# Altium schematic symbol library jlcpcb_2025_04_capacitors_extended_1210.schlib: 709 symbols (part 4 of 4) (continued)
## GRM32ER61C226KE20L
designator C?  Capacitance: 22uF  (hidden comment: *)
Capacitor, Ceramic (MLCC), 22uF, ±10%, 16V, X5R, ±10%, SMD 1210; Manufacturer: Murata Electronics; Manufacturer Part Number: GRM32ER61C226KE20L; Package Size: 1210; JLCPCB Basic Part: No; JLCPCB Part Number: C86051; Supplier 1: LCSC; Category: Capacitors - MLCC; Supplier Part Number 1: C86051; Tolerance: ±10%; Voltage Rating: 16V; Temperature Coefficient: X5R; RoHS: Yes; ComponentLink1Description: Datasheet; ComponentLink1URL: https://wmsc.lcsc.com/wmsc/upload/file/pdf/v2/lcsc/2304140030_Murata-Electronics-GRM32ER61C226KE20L_C86051.pdf; ComponentLink2Description: JLCPCB Part URL; ComponentLink2URL: https://jlcpcb.com/partdetail/C86051; ComponentLink3Description: LCSC Part URL; ComponentLink3URL: https://lcsc.com/product-detail/Multilayer-Ceramic-Capacitors-MLCC---SMD-SMT_Murata-Electronics-Murata-Electronics-GRM32ER61C226KE20L_C86051.html
footprint CAP-1210 (1210 (3225M) Capacitor)
pins: 1, 2

## GRM32ER61C476KE15K
designator C?  Capacitance: 47uF  (hidden comment: *)
Capacitor, Ceramic (MLCC), 47uF, ±10%, 16V, X5R, ±10%, SMD 1210; Manufacturer: Murata Electronics; Manufacturer Part Number: GRM32ER61C476KE15K; Package Size: 1210; JLCPCB Basic Part: No; JLCPCB Part Number: C3908068; Supplier 1: LCSC; Category: Capacitors - MLCC; Supplier Part Number 1: C3908068; Tolerance: ±10%; Voltage Rating: 16V; Temperature Coefficient: X5R; RoHS: Yes; ComponentLink1Description: Datasheet; ComponentLink1URL: https://wmsc.lcsc.com/wmsc/upload/file/pdf/v2/lcsc/2308111519_Murata-Electronics-GRM32ER61C476KE15K_C3908068.pdf; ComponentLink2Description: JLCPCB Part URL; ComponentLink2URL: https://jlcpcb.com/partdetail/C3908068; ComponentLink3Description: LCSC Part URL; ComponentLink3URL: https://lcsc.com/product-detail/Multilayer-Ceramic-Capacitors-MLCC---SMD-SMT_Murata-Electronics-Murata-Electronics-GRM32ER61C476KE15K_C3908068.html
footprint CAP-1210 (1210 (3225M) Capacitor)
pins: 1, 2

## GRM32ER61C476KE15L
designator C?  Capacitance: 47uF  (hidden comment: *)
Capacitor, Ceramic (MLCC), 47uF, ±10%, 16V, X5R, ±10%, SMD 1210; Manufacturer: Murata Electronics; Manufacturer Part Number: GRM32ER61C476KE15L; Package Size: 1210; JLCPCB Basic Part: No; JLCPCB Part Number: C77101; Supplier 1: LCSC; Category: Capacitors - MLCC; Supplier Part Number 1: C77101; Tolerance: ±10%; Voltage Rating: 16V; Temperature Coefficient: X5R; RoHS: Yes; ComponentLink1Description: Datasheet; ComponentLink1URL: https://wmsc.lcsc.com/wmsc/upload/file/pdf/v2/lcsc/2212021100_Murata-Electronics-GRM32ER61C476KE15L_C77101.pdf; ComponentLink2Description: JLCPCB Part URL; ComponentLink2URL: https://jlcpcb.com/partdetail/C77101; ComponentLink3Description: LCSC Part URL; ComponentLink3URL: https://lcsc.com/product-detail/Multilayer-Ceramic-Capacitors-MLCC---SMD-SMT_Murata-Electronics-Murata-Electronics-GRM32ER61C476KE15L_C77101.html
footprint CAP-1210 (1210 (3225M) Capacitor)
pins: 1, 2

## GRM32ER61C476ME15L
designator C?  Capacitance: 47uF  (hidden comment: *)
Capacitor, Ceramic (MLCC), 47uF, ±20%, 16V, X5R, ±20%, SMD 1210; Manufacturer: Murata Electronics; Manufacturer Part Number: GRM32ER61C476ME15L; Package Size: 1210; JLCPCB Basic Part: No; JLCPCB Part Number: C412254; Supplier 1: LCSC; Category: Capacitors - MLCC; Supplier Part Number 1: C412254; Tolerance: ±20%; Voltage Rating: 16V; Temperature Coefficient: X5R; RoHS: Yes; ComponentLink1Description: Datasheet; ComponentLink1URL: https://wmsc.lcsc.com/wmsc/upload/file/pdf/v2/lcsc/2304140030_Murata-Electronics-GRM32ER61C476ME15L_C412254.pdf; ComponentLink2Description: JLCPCB Part URL; ComponentLink2URL: https://jlcpcb.com/partdetail/C412254; ComponentLink3Description: LCSC Part URL; ComponentLink3URL: https://lcsc.com/product-detail/Multilayer-Ceramic-Capacitors-MLCC---SMD-SMT_Murata-Electronics-Murata-Electronics-GRM32ER61C476ME15L_C412254.html
footprint CAP-1210 (1210 (3225M) Capacitor)
pins: 1, 2

## GRM32ER61E226KE15K
designator C?  Capacitance: 22uF  (hidden comment: *)
Capacitor, Ceramic (MLCC), 22uF, ±10%, 25V, X5R, ±10%, SMD 1210; Manufacturer: Murata Electronics; Manufacturer Part Number: GRM32ER61E226KE15K; Package Size: 1210; JLCPCB Basic Part: No; JLCPCB Part Number: C185655; Supplier 1: LCSC; Category: Capacitors - MLCC; Supplier Part Number 1: C185655; Tolerance: ±10%; Voltage Rating: 25V; Temperature Coefficient: X5R; RoHS: Yes; ComponentLink1Description: Datasheet; ComponentLink1URL: https://wmsc.lcsc.com/wmsc/upload/file/pdf/v2/lcsc/1810250922_Murata-Electronics-GRM32ER61E226KE15K_C185655.pdf; ComponentLink2Description: JLCPCB Part URL; ComponentLink2URL: https://jlcpcb.com/partdetail/C185655; ComponentLink3Description: LCSC Part URL; ComponentLink3URL: https://lcsc.com/product-detail/Multilayer-Ceramic-Capacitors-MLCC---SMD-SMT_Murata-Electronics-Murata-Electronics-GRM32ER61E226KE15K_C185655.html
footprint CAP-1210 (1210 (3225M) Capacitor)
pins: 1, 2

## GRM32ER61E226KE15L
designator C?  Capacitance: 22uF  (hidden comment: *)
Capacitor, Ceramic (MLCC), 22uF, ±10%, 25V, X5R, ±10%, SMD 1210; Manufacturer: Murata Electronics; Manufacturer Part Number: GRM32ER61E226KE15L; Package Size: 1210; JLCPCB Basic Part: No; JLCPCB Part Number: C65428; Supplier 1: LCSC; Category: Capacitors - MLCC; Supplier Part Number 1: C65428; Tolerance: ±10%; Voltage Rating: 25V; Temperature Coefficient: X5R; RoHS: Yes; ComponentLink1Description: Datasheet; ComponentLink1URL: https://wmsc.lcsc.com/wmsc/upload/file/pdf/v2/lcsc/1810250907_Murata-Electronics-GRM32ER61E226KE15L_C65428.pdf; ComponentLink2Description: JLCPCB Part URL; ComponentLink2URL: https://jlcpcb.com/partdetail/C65428; ComponentLink3Description: LCSC Part URL; ComponentLink3URL: https://lcsc.com/product-detail/Multilayer-Ceramic-Capacitors-MLCC---SMD-SMT_Murata-Electronics-Murata-Electronics-GRM32ER61E226KE15L_C65428.html
footprint CAP-1210 (1210 (3225M) Capacitor)
pins: 1, 2

## GRM32ER61E226ME15L
designator C?  Capacitance: 22uF  (hidden comment: *)
Capacitor, Ceramic (MLCC), 22uF, ±20%, 25V, X5R, ±20%, SMD 1210; Manufacturer: Murata Electronics; Manufacturer Part Number: GRM32ER61E226ME15L; Package Size: 1210; JLCPCB Basic Part: No; JLCPCB Part Number: C97971; Supplier 1: LCSC; Category: Capacitors - MLCC; Supplier Part Number 1: C97971; Tolerance: ±20%; Voltage Rating: 25V; Temperature Coefficient: X5R; RoHS: Yes; ComponentLink1Description: Datasheet; ComponentLink1URL: https://wmsc.lcsc.com/wmsc/upload/file/pdf/v2/lcsc/1810250908_Murata-Electronics-GRM32ER61E226ME15L_C97971.pdf; ComponentLink2Description: JLCPCB Part URL; ComponentLink2URL: https://jlcpcb.com/partdetail/C97971; ComponentLink3Description: LCSC Part URL; ComponentLink3URL: https://lcsc.com/product-detail/Multilayer-Ceramic-Capacitors-MLCC---SMD-SMT_Murata-Electronics-Murata-Electronics-GRM32ER61E226ME15L_C97971.html
footprint CAP-1210 (1210 (3225M) Capacitor)
pins: 1, 2

## GRM32ER61H106KA12L
designator C?  Capacitance: 10uF  (hidden comment: *)
Capacitor, Ceramic (MLCC), 10uF, ±10%, 50V, X5R, ±10%, SMD 1210; Manufacturer: Murata Electronics; Manufacturer Part Number: GRM32ER61H106KA12L; Package Size: 1210; JLCPCB Basic Part: No; JLCPCB Part Number: C412253; Supplier 1: LCSC; Category: Capacitors - MLCC; Supplier Part Number 1: C412253; Tolerance: ±10%; Voltage Rating: 50V; Temperature Coefficient: X5R; RoHS: Yes; ComponentLink1Description: Datasheet; ComponentLink1URL: https://wmsc.lcsc.com/wmsc/upload/file/pdf/v2/lcsc/2304140030_Murata-Electronics-GRM32ER61H106KA12L_C412253.pdf; ComponentLink2Description: JLCPCB Part URL; ComponentLink2URL: https://jlcpcb.com/partdetail/C412253; ComponentLink3Description: LCSC Part URL; ComponentLink3URL: https://lcsc.com/product-detail/Multilayer-Ceramic-Capacitors-MLCC---SMD-SMT_Murata-Electronics-Murata-Electronics-GRM32ER61H106KA12L_C412253.html
footprint CAP-1210 (1210 (3225M) Capacitor)
pins: 1, 2

## GRM32ER70J476KE20L
designator C?  Capacitance: 47uF  (hidden comment: *)
Capacitor, Ceramic (MLCC), 47uF, ±10%, 6.3V, X7R, ±10%, SMD 1210; Manufacturer: Murata Electronics; Manufacturer Part Number: GRM32ER70J476KE20L; Package Size: 1210; JLCPCB Basic Part: No; JLCPCB Part Number: C440210; Supplier 1: LCSC; Category: Capacitors - MLCC; Supplier Part Number 1: C440210; Tolerance: ±10%; Voltage Rating: 6.3V; Temperature Coefficient: X7R; RoHS: Yes; ComponentLink1Description: Datasheet; ComponentLink1URL: https://wmsc.lcsc.com/wmsc/upload/file/pdf/v2/lcsc/2304140030_Murata-Electronics-GRM32ER70J476KE20L_C440210.pdf; ComponentLink2Description: JLCPCB Part URL; ComponentLink2URL: https://jlcpcb.com/partdetail/C440210; ComponentLink3Description: LCSC Part URL; ComponentLink3URL: https://lcsc.com/product-detail/Multilayer-Ceramic-Capacitors-MLCC---SMD-SMT_Murata-Electronics-Murata-Electronics-GRM32ER70J476KE20L_C440210.html
footprint CAP-1210 (1210 (3225M) Capacitor)
pins: 1, 2

## GRM32ER70J476ME20L
designator C?  Capacitance: 47uF  (hidden comment: *)
Capacitor, Ceramic (MLCC), 47uF, ±20%, 6.3V, X7R, ±20%, SMD 1210; Manufacturer: Murata Electronics; Manufacturer Part Number: GRM32ER70J476ME20L; Package Size: 1210; JLCPCB Basic Part: No; JLCPCB Part Number: C415374; Supplier 1: LCSC; Category: Capacitors - MLCC; Supplier Part Number 1: C415374; Tolerance: ±20%; Voltage Rating: 6.3V; Temperature Coefficient: X7R; RoHS: Yes; ComponentLink1Description: Datasheet; ComponentLink1URL: https://wmsc.lcsc.com/wmsc/upload/file/pdf/v2/lcsc/2304140030_Murata-Electronics-GRM32ER70J476ME20L_C415374.pdf; ComponentLink2Description: JLCPCB Part URL; ComponentLink2URL: https://jlcpcb.com/partdetail/C415374; ComponentLink3Description: LCSC Part URL; ComponentLink3URL: https://lcsc.com/product-detail/Multilayer-Ceramic-Capacitors-MLCC---SMD-SMT_Murata-Electronics-Murata-Electronics-GRM32ER70J476ME20L_C415374.html
footprint CAP-1210 (1210 (3225M) Capacitor)
pins: 1, 2

## GRM32ER71A226ME20L
designator C?  Capacitance: 22uF  (hidden comment: *)
Capacitor, Ceramic (MLCC), 22uF, ±20%, 10V, X7R, ±20%, SMD 1210; Manufacturer: Murata Electronics; Manufacturer Part Number: GRM32ER71A226ME20L; Package Size: 1210; JLCPCB Basic Part: No; JLCPCB Part Number: C527971; Supplier 1: LCSC; Category: Capacitors - MLCC; Supplier Part Number 1: C527971; Tolerance: ±20%; Voltage Rating: 10V; Temperature Coefficient: X7R; RoHS: Yes; ComponentLink1Description: Datasheet; ComponentLink1URL: https://wmsc.lcsc.com/wmsc/upload/file/pdf/v2/lcsc/2304140030_Murata-Electronics-GRM32ER71A226ME20L_C527971.pdf; ComponentLink2Description: JLCPCB Part URL; ComponentLink2URL: https://jlcpcb.com/partdetail/C527971; ComponentLink3Description: LCSC Part URL; ComponentLink3URL: https://lcsc.com/product-detail/Multilayer-Ceramic-Capacitors-MLCC---SMD-SMT_Murata-Electronics-Murata-Electronics-GRM32ER71A226ME20L_C527971.html
footprint CAP-1210 (1210 (3225M) Capacitor)
pins: 1, 2

## GRM32ER71A476KE15L
designator C?  Capacitance: 47uF  (hidden comment: *)
Capacitor, Ceramic (MLCC), 47uF, ±10%, 10V, X7R, ±10%, SMD 1210; Manufacturer: Murata Electronics; Manufacturer Part Number: GRM32ER71A476KE15L; Package Size: 1210; JLCPCB Basic Part: No; JLCPCB Part Number: C84494; Supplier 1: LCSC; Category: Capacitors - MLCC; Supplier Part Number 1: C84494; Tolerance: ±10%; Voltage Rating: 10V; Temperature Coefficient: X7R; RoHS: Yes; ComponentLink1Description: Datasheet; ComponentLink1URL: https://wmsc.lcsc.com/wmsc/upload/file/pdf/v2/lcsc/1811071031_Murata-Electronics-GRM32ER71A476KE15L_C84494.pdf; ComponentLink2Description: JLCPCB Part URL; ComponentLink2URL: https://jlcpcb.com/partdetail/C84494; ComponentLink3Description: LCSC Part URL; ComponentLink3URL: https://lcsc.com/product-detail/Multilayer-Ceramic-Capacitors-MLCC---SMD-SMT_Murata-Electronics-Murata-Electronics-GRM32ER71A476KE15L_C84494.html
footprint CAP-1210 (1210 (3225M) Capacitor)
pins: 1, 2

## GRM32ER71A476ME15L
designator C?  Capacitance: 47uF  (hidden comment: *)
Capacitor, Ceramic (MLCC), 47uF, ±20%, 10V, X7R, ±20%, SMD 1210; Manufacturer: Murata Electronics; Manufacturer Part Number: GRM32ER71A476ME15L; Package Size: 1210; JLCPCB Basic Part: No; JLCPCB Part Number: C415541; Supplier 1: LCSC; Category: Capacitors - MLCC; Supplier Part Number 1: C415541; Tolerance: ±20%; Voltage Rating: 10V; Temperature Coefficient: X7R; RoHS: Yes; ComponentLink1Description: Datasheet; ComponentLink1URL: https://wmsc.lcsc.com/wmsc/upload/file/pdf/v2/lcsc/2304140030_Murata-Electronics-GRM32ER71A476ME15L_C415541.pdf; ComponentLink2Description: JLCPCB Part URL; ComponentLink2URL: https://jlcpcb.com/partdetail/C415541; ComponentLink3Description: LCSC Part URL; ComponentLink3URL: https://lcsc.com/product-detail/Multilayer-Ceramic-Capacitors-MLCC---SMD-SMT_Murata-Electronics-Murata-Electronics-GRM32ER71A476ME15L_C415541.html
footprint CAP-1210 (1210 (3225M) Capacitor)
pins: 1, 2

## GRM32ER71C226KEA8L
designator C?  Capacitance: 22uF  (hidden comment: *)
Capacitor, Ceramic (MLCC), 22uF, ±10%, 16V, X7R, ±10%, SMD 1210; Manufacturer: Murata Electronics; Manufacturer Part Number: GRM32ER71C226KEA8L; Package Size: 1210; JLCPCB Basic Part: No; JLCPCB Part Number: C703078; Supplier 1: LCSC; Category: Capacitors - MLCC; Supplier Part Number 1: C703078; Tolerance: ±10%; Voltage Rating: 16V; Temperature Coefficient: X7R; RoHS: Yes; ComponentLink1Description: Datasheet; ComponentLink1URL: https://wmsc.lcsc.com/wmsc/upload/file/pdf/v2/lcsc/2304140030_Murata-Electronics-GRM32ER71C226KEA8L_C703078.pdf; ComponentLink2Description: JLCPCB Part URL; ComponentLink2URL: https://jlcpcb.com/partdetail/C703078; ComponentLink3Description: LCSC Part URL; ComponentLink3URL: https://lcsc.com/product-detail/Multilayer-Ceramic-Capacitors-MLCC---SMD-SMT_Murata-Electronics-Murata-Electronics-GRM32ER71C226KEA8L_C703078.html
footprint CAP-1210 (1210 (3225M) Capacitor)
pins: 1, 2

## GRM32ER71C226MEA8L
designator C?  Capacitance: 22uF  (hidden comment: *)
Capacitor, Ceramic (MLCC), 22uF, ±20%, 16V, X7R, ±20%, SMD 1210; Manufacturer: Murata Electronics; Manufacturer Part Number: GRM32ER71C226MEA8L; Package Size: 1210; JLCPCB Basic Part: No; JLCPCB Part Number: C415372; Supplier 1: LCSC; Category: Capacitors - MLCC; Supplier Part Number 1: C415372; Tolerance: ±20%; Voltage Rating: 16V; Temperature Coefficient: X7R; RoHS: Yes; ComponentLink1Description: Datasheet; ComponentLink1URL: https://wmsc.lcsc.com/wmsc/upload/file/pdf/v2/lcsc/2304140030_Murata-Electronics-GRM32ER71C226MEA8L_C415372.pdf; ComponentLink2Description: JLCPCB Part URL; ComponentLink2URL: https://jlcpcb.com/partdetail/C415372; ComponentLink3Description: LCSC Part URL; ComponentLink3URL: https://lcsc.com/product-detail/Multilayer-Ceramic-Capacitors-MLCC---SMD-SMT_Murata-Electronics-Murata-Electronics-GRM32ER71C226MEA8L_C415372.html
footprint CAP-1210 (1210 (3225M) Capacitor)
pins: 1, 2

## GRM32ER71E226ME15K
designator C?  Capacitance: 22uF  (hidden comment: *)
Capacitor, Ceramic (MLCC), 22uF, ±20%, 25V, X7R, ±20%, SMD 1210; Manufacturer: Murata Electronics; Manufacturer Part Number: GRM32ER71E226ME15K; Package Size: 1210; JLCPCB Basic Part: No; JLCPCB Part Number: C2167828; Supplier 1: LCSC; Category: Capacitors - MLCC; Supplier Part Number 1: C2167828; Tolerance: ±20%; Voltage Rating: 25V; Temperature Coefficient: X7R; RoHS: Yes; ComponentLink1Description: Datasheet; ComponentLink1URL: https://wmsc.lcsc.com/wmsc/upload/file/pdf/v2/lcsc/2202040230_Murata-Electronics-GRM32ER71E226ME15K_C2167828.pdf; ComponentLink2Description: JLCPCB Part URL; ComponentLink2URL: https://jlcpcb.com/partdetail/C2167828; ComponentLink3Description: LCSC Part URL; ComponentLink3URL: https://lcsc.com/product-detail/Multilayer-Ceramic-Capacitors-MLCC---SMD-SMT_Murata-Electronics-Murata-Electronics-GRM32ER71E226ME15K_C2167828.html
footprint CAP-1210 (1210 (3225M) Capacitor)
pins: 1, 2

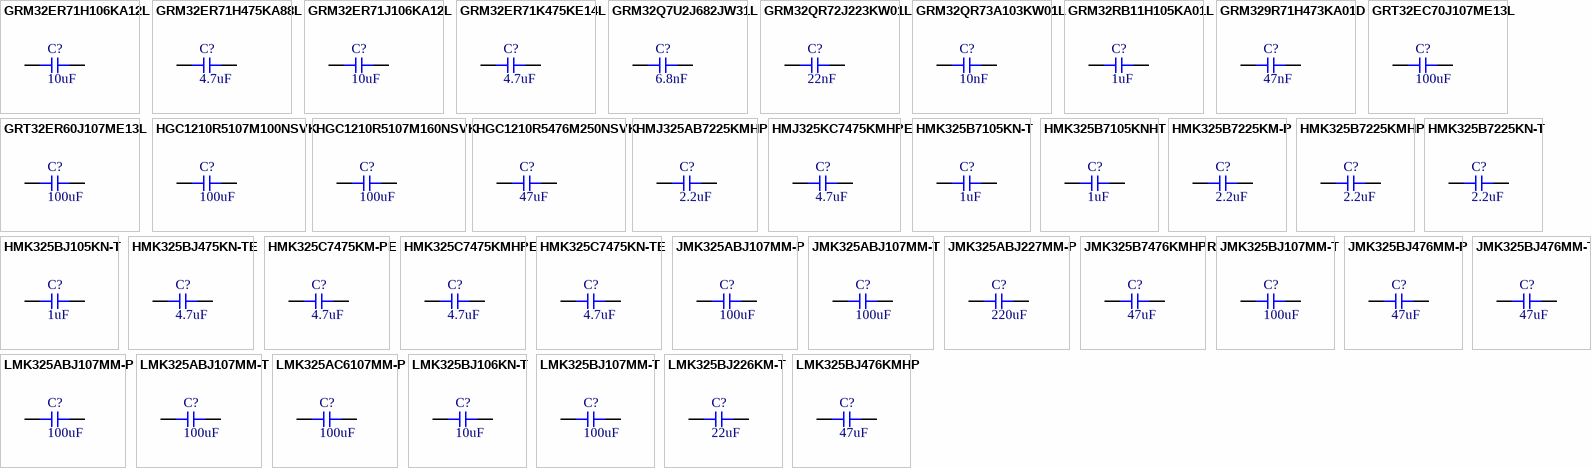
[diagram p15: symbols GRM32ER71H106KA12L to LMK325BJ476KMHP]

## GRM32ER71H106KA12L
designator C?  Capacitance: 10uF  (hidden comment: *)
Capacitor, Ceramic (MLCC), 10uF, ±10%, 50V, X7R, ±10%, SMD 1210; Manufacturer: Murata Electronics; Manufacturer Part Number: GRM32ER71H106KA12L; Package Size: 1210; JLCPCB Basic Part: No; JLCPCB Part Number: C77102; Supplier 1: LCSC; Category: Capacitors - MLCC; Supplier Part Number 1: C77102; Tolerance: ±10%; Voltage Rating: 50V; Temperature Coefficient: X7R; RoHS: Yes; ComponentLink1Description: Datasheet; ComponentLink1URL: https://wmsc.lcsc.com/wmsc/upload/file/pdf/v2/lcsc/2304140030_Murata-Electronics-GRM32ER71H106KA12L_C77102.pdf; ComponentLink2Description: JLCPCB Part URL; ComponentLink2URL: https://jlcpcb.com/partdetail/C77102; ComponentLink3Description: LCSC Part URL; ComponentLink3URL: https://lcsc.com/product-detail/Multilayer-Ceramic-Capacitors-MLCC---SMD-SMT_Murata-Electronics-Murata-Electronics-GRM32ER71H106KA12L_C77102.html
footprint CAP-1210 (1210 (3225M) Capacitor)
pins: 1, 2

## GRM32ER71H475KA88L
designator C?  Capacitance: 4.7uF  (hidden comment: *)
Capacitor, Ceramic (MLCC), 4.7uF, ±10%, 50V, X7R, ±10%, SMD 1210; Manufacturer: Murata Electronics; Manufacturer Part Number: GRM32ER71H475KA88L; Package Size: 1210; JLCPCB Basic Part: No; JLCPCB Part Number: C86052; Supplier 1: LCSC; Category: Capacitors - MLCC; Supplier Part Number 1: C86052; Tolerance: ±10%; Voltage Rating: 50V; Temperature Coefficient: X7R; RoHS: Yes; ComponentLink1Description: Datasheet; ComponentLink1URL: https://wmsc.lcsc.com/wmsc/upload/file/pdf/v2/lcsc/2304140030_Murata-Electronics-GRM32ER71H475KA88L_C86052.pdf; ComponentLink2Description: JLCPCB Part URL; ComponentLink2URL: https://jlcpcb.com/partdetail/C86052; ComponentLink3Description: LCSC Part URL; ComponentLink3URL: https://lcsc.com/product-detail/Multilayer-Ceramic-Capacitors-MLCC---SMD-SMT_Murata-Electronics-Murata-Electronics-GRM32ER71H475KA88L_C86052.html
footprint CAP-1210 (1210 (3225M) Capacitor)
pins: 1, 2

## GRM32ER71J106KA12L
designator C?  Capacitance: 10uF  (hidden comment: *)
Capacitor, Ceramic (MLCC), 10uF, ±10%, 63V, X7R, ±10%, SMD 1210; Manufacturer: Murata Electronics; Manufacturer Part Number: GRM32ER71J106KA12L; Package Size: 1210; JLCPCB Basic Part: No; JLCPCB Part Number: C437568; Supplier 1: LCSC; Category: Capacitors - MLCC; Supplier Part Number 1: C437568; Tolerance: ±10%; Voltage Rating: 63V; Temperature Coefficient: X7R; RoHS: Yes; ComponentLink1Description: Datasheet; ComponentLink1URL: https://wmsc.lcsc.com/wmsc/upload/file/pdf/v2/lcsc/2304101000_Murata-Electronics-GRM32ER71J106KA12L_C437568.pdf; ComponentLink2Description: JLCPCB Part URL; ComponentLink2URL: https://jlcpcb.com/partdetail/C437568; ComponentLink3Description: LCSC Part URL; ComponentLink3URL: https://lcsc.com/product-detail/Multilayer-Ceramic-Capacitors-MLCC---SMD-SMT_Murata-Electronics-Murata-Electronics-GRM32ER71J106KA12L_C437568.html
footprint CAP-1210 (1210 (3225M) Capacitor)
pins: 1, 2

## GRM32ER71K475KE14L
designator C?  Capacitance: 4.7uF  (hidden comment: *)
Capacitor, Ceramic (MLCC), 4.7uF, ±10%, 80V, X7R, ±10%, SMD 1210; Manufacturer: Murata Electronics; Manufacturer Part Number: GRM32ER71K475KE14L; Package Size: 1210; JLCPCB Basic Part: No; JLCPCB Part Number: C711060; Supplier 1: LCSC; Category: Capacitors - MLCC; Supplier Part Number 1: C711060; Tolerance: ±10%; Voltage Rating: 80V; Temperature Coefficient: X7R; RoHS: Yes; ComponentLink1Description: Datasheet; ComponentLink1URL: https://wmsc.lcsc.com/wmsc/upload/file/pdf/v2/lcsc/2110221030_Murata-Electronics-GRM32ER71K475KE14L_C711060.pdf; ComponentLink2Description: JLCPCB Part URL; ComponentLink2URL: https://jlcpcb.com/partdetail/C711060; ComponentLink3Description: LCSC Part URL; ComponentLink3URL: https://lcsc.com/product-detail/Multilayer-Ceramic-Capacitors-MLCC---SMD-SMT_Murata-Electronics-Murata-Electronics-GRM32ER71K475KE14L_C711060.html
footprint CAP-1210 (1210 (3225M) Capacitor)
pins: 1, 2

## GRM32Q7U2J682JW31L
designator C?  Capacitance: 6.8nF  (hidden comment: *)
Capacitor, Ceramic (MLCC), 6.8nF, ±5%, 630V, U2J, ±5%, SMD 1210; Manufacturer: Murata Electronics; Manufacturer Part Number: GRM32Q7U2J682JW31L; Package Size: 1210; JLCPCB Basic Part: No; JLCPCB Part Number: C162516; Supplier 1: LCSC; Category: Capacitors - MLCC; Supplier Part Number 1: C162516; Tolerance: ±5%; Voltage Rating: 630V; Temperature Coefficient: U2J; RoHS: Yes; ComponentLink1Description: Datasheet; ComponentLink1URL: https://wmsc.lcsc.com/wmsc/upload/file/pdf/v2/lcsc/1810250910_Murata-Electronics-GRM32Q7U2J682JW31L_C162516.pdf; ComponentLink2Description: JLCPCB Part URL; ComponentLink2URL: https://jlcpcb.com/partdetail/C162516; ComponentLink3Description: LCSC Part URL; ComponentLink3URL: https://lcsc.com/product-detail/Multilayer-Ceramic-Capacitors-MLCC---SMD-SMT_Murata-Electronics-Murata-Electronics-GRM32Q7U2J682JW31L_C162516.html
footprint CAP-1210 (1210 (3225M) Capacitor)
pins: 1, 2

## GRM32QR72J223KW01L
designator C?  Capacitance: 22nF  (hidden comment: *)
Capacitor, Ceramic (MLCC), 22nF, ±10%, 630V, X7R, ±10%, SMD 1210; Manufacturer: Murata Electronics; Manufacturer Part Number: GRM32QR72J223KW01L; Package Size: 1210; JLCPCB Basic Part: No; JLCPCB Part Number: C440211; Supplier 1: LCSC; Category: Capacitors - MLCC; Supplier Part Number 1: C440211; Tolerance: ±10%; Voltage Rating: 630V; Temperature Coefficient: X7R; RoHS: Yes; ComponentLink1Description: Datasheet; ComponentLink1URL: https://wmsc.lcsc.com/wmsc/upload/file/pdf/v2/lcsc/2201242200_Murata-Electronics-GRM32QR72J223KW01L_C440211.pdf; ComponentLink2Description: JLCPCB Part URL; ComponentLink2URL: https://jlcpcb.com/partdetail/C440211; ComponentLink3Description: LCSC Part URL; ComponentLink3URL: https://lcsc.com/product-detail/Multilayer-Ceramic-Capacitors-MLCC---SMD-SMT_Murata-Electronics-Murata-Electronics-GRM32QR72J223KW01L_C440211.html
footprint CAP-1210 (1210 (3225M) Capacitor)
pins: 1, 2

## GRM32QR73A103KW01L
designator C?  Capacitance: 10nF  (hidden comment: *)
Capacitor, Ceramic (MLCC), 10nF, ±10%, 1kV, X7R, ±10%, SMD 1210; Manufacturer: Murata Electronics; Manufacturer Part Number: GRM32QR73A103KW01L; Package Size: 1210; JLCPCB Basic Part: No; JLCPCB Part Number: C97974; Supplier 1: LCSC; Category: Capacitors - MLCC; Supplier Part Number 1: C97974; Tolerance: ±10%; Voltage Rating: 1kV; Temperature Coefficient: X7R; RoHS: Yes; ComponentLink1Description: Datasheet; ComponentLink1URL: https://wmsc.lcsc.com/wmsc/upload/file/pdf/v2/lcsc/1810250911_Murata-Electronics-GRM32QR73A103KW01L_C97974.pdf; ComponentLink2Description: JLCPCB Part URL; ComponentLink2URL: https://jlcpcb.com/partdetail/C97974; ComponentLink3Description: LCSC Part URL; ComponentLink3URL: https://lcsc.com/product-detail/Multilayer-Ceramic-Capacitors-MLCC---SMD-SMT_Murata-Electronics-Murata-Electronics-GRM32QR73A103KW01L_C97974.html
footprint CAP-1210 (1210 (3225M) Capacitor)
pins: 1, 2

## GRM32RB11H105KA01L
designator C?  Capacitance: 1uF  (hidden comment: *)
Capacitor, Ceramic (MLCC), 1uF, ±10%, ±10%, SMD 1210; Manufacturer: Murata Electronics; Manufacturer Part Number: GRM32RB11H105KA01L; Package Size: 1210; JLCPCB Basic Part: No; JLCPCB Part Number: C913670; Supplier 1: LCSC; Category: Capacitors - MLCC; Supplier Part Number 1: C913670; Tolerance: ±10%; RoHS: Yes; ComponentLink1Description: Datasheet; ComponentLink1URL: https://wmsc.lcsc.com/wmsc/upload/file/pdf/v2/lcsc/2201131300_Murata-Electronics-GRM32RB11H105KA01L_C913670.pdf; ComponentLink2Description: JLCPCB Part URL; ComponentLink2URL: https://jlcpcb.com/partdetail/C913670; ComponentLink3Description: LCSC Part URL; ComponentLink3URL: https://lcsc.com/product-detail/Multilayer-Ceramic-Capacitors-MLCC---SMD-SMT_Murata-Electronics-Murata-Electronics-GRM32RB11H105KA01L_C913670.html
footprint CAP-1210 (1210 (3225M) Capacitor)
pins: 1, 2

## GRM329R71H473KA01D
designator C?  Capacitance: 47nF  (hidden comment: *)
Capacitor, Ceramic (MLCC), 47nF, ±10%, ±10%, SMD 1210; Manufacturer: Murata Electronics; Manufacturer Part Number: GRM329R71H473KA01D; Package Size: 1210; JLCPCB Basic Part: No; JLCPCB Part Number: C913575; Supplier 1: LCSC; Category: Capacitors - MLCC; Supplier Part Number 1: C913575; Tolerance: ±10%; RoHS: Yes; ComponentLink1Description: Datasheet; ComponentLink1URL: https://wmsc.lcsc.com/wmsc/upload/file/pdf/v2/lcsc/2201131300_Murata-Electronics-GRM329R71H473KA01D_C913575.pdf; ComponentLink2Description: JLCPCB Part URL; ComponentLink2URL: https://jlcpcb.com/partdetail/C913575; ComponentLink3Description: LCSC Part URL; ComponentLink3URL: https://lcsc.com/product-detail/Multilayer-Ceramic-Capacitors-MLCC---SMD-SMT_Murata-Electronics-Murata-Electronics-GRM329R71H473KA01D_C913575.html
footprint CAP-1210 (1210 (3225M) Capacitor)
pins: 1, 2

## GRT32EC70J107ME13L
designator C?  Capacitance: 100uF  (hidden comment: *)
Capacitor, Ceramic (MLCC), 100uF, ±20%, 6.3V, X7S, ±20%, SMD 1210; Manufacturer: Murata Electronics; Manufacturer Part Number: GRT32EC70J107ME13L; Package Size: 1210; JLCPCB Basic Part: No; JLCPCB Part Number: C3895776; Supplier 1: LCSC; Category: Capacitors - MLCC; Supplier Part Number 1: C3895776; Tolerance: ±20%; Voltage Rating: 6.3V; Temperature Coefficient: X7S; RoHS: Yes; ComponentLink1Description: Datasheet; ComponentLink1URL: https://wmsc.lcsc.com/wmsc/upload/file/pdf/v2/lcsc/2401212350_Murata-Electronics-GRT32EC70J107ME13L_C3895776.pdf; ComponentLink2Description: JLCPCB Part URL; ComponentLink2URL: https://jlcpcb.com/partdetail/C3895776; ComponentLink3Description: LCSC Part URL; ComponentLink3URL: https://lcsc.com/product-detail/Multilayer-Ceramic-Capacitors-MLCC---SMD-SMT_Murata-Electronics-Murata-Electronics-GRT32EC70J107ME13L_C3895776.html
footprint CAP-1210 (1210 (3225M) Capacitor)
pins: 1, 2

## GRT32ER60J107ME13L
designator C?  Capacitance: 100uF  (hidden comment: *)
Capacitor, Ceramic (MLCC), 100uF, ±20%, 6.3V, X5R, ±20%, SMD 1210; Manufacturer: Murata Electronics; Manufacturer Part Number: GRT32ER60J107ME13L; Package Size: 1210; JLCPCB Basic Part: No; JLCPCB Part Number: C711111; Supplier 1: LCSC; Category: Capacitors - MLCC; Supplier Part Number 1: C711111; Tolerance: ±20%; Voltage Rating: 6.3V; Temperature Coefficient: X5R; RoHS: Yes; ComponentLink1Description: Datasheet; ComponentLink1URL: https://wmsc.lcsc.com/wmsc/upload/file/pdf/v2/lcsc/2205311730_Murata-Electronics-GRT32ER60J107ME13L_C711111.pdf; ComponentLink2Description: JLCPCB Part URL; ComponentLink2URL: https://jlcpcb.com/partdetail/C711111; ComponentLink3Description: LCSC Part URL; ComponentLink3URL: https://lcsc.com/product-detail/Multilayer-Ceramic-Capacitors-MLCC---SMD-SMT_Murata-Electronics-Murata-Electronics-GRT32ER60J107ME13L_C711111.html
footprint CAP-1210 (1210 (3225M) Capacitor)
pins: 1, 2

## HGC1210R5107M100NSVK
designator C?  Capacitance: 100uF  (hidden comment: *)
Capacitor, Ceramic (MLCC), 100uF, ±20%, 10V, X5R, ±20%, SMD 1210; Manufacturer: Chinocera; Manufacturer Part Number: HGC1210R5107M100NSVK; Package Size: 1210; JLCPCB Basic Part: No; JLCPCB Part Number: C7472977; Supplier 1: LCSC; Category: Capacitors - MLCC; Supplier Part Number 1: C7472977; Tolerance: ±20%; Voltage Rating: 10V; Temperature Coefficient: X5R; RoHS: Yes; ComponentLink1Description: Datasheet; ComponentLink1URL: https://wmsc.lcsc.com/wmsc/upload/file/pdf/v2/lcsc/2403201122_Chinocera-HGC1210R5107M100NSVK_C7472977.pdf; ComponentLink2Description: JLCPCB Part URL; ComponentLink2URL: https://jlcpcb.com/partdetail/C7472977; ComponentLink3Description: LCSC Part URL; ComponentLink3URL: https://lcsc.com/product-detail/Multilayer-Ceramic-Capacitors-MLCC---SMD-SMT_Chinocera-Chinocera-HGC1210R5107M100NSVK_C7472977.html
footprint CAP-1210 (1210 (3225M) Capacitor)
pins: 1, 2

## HGC1210R5107M160NSVK
designator C?  Capacitance: 100uF  (hidden comment: *)
Capacitor, Ceramic (MLCC), 100uF, ±20%, 16V, X5R, ±20%, SMD 1210; Manufacturer: Chinocera; Manufacturer Part Number: HGC1210R5107M160NSVK; Package Size: 1210; JLCPCB Basic Part: No; JLCPCB Part Number: C7432790; Supplier 1: LCSC; Category: Capacitors - MLCC; Supplier Part Number 1: C7432790; Tolerance: ±20%; Voltage Rating: 16V; Temperature Coefficient: X5R; RoHS: Yes; ComponentLink1Description: Datasheet; ComponentLink1URL: https://wmsc.lcsc.com/wmsc/upload/file/pdf/v2/lcsc/2403201122_Chinocera-HGC1210R5107M160NSVK_C7432790.pdf; ComponentLink2Description: JLCPCB Part URL; ComponentLink2URL: https://jlcpcb.com/partdetail/C7432790; ComponentLink3Description: LCSC Part URL; ComponentLink3URL: https://lcsc.com/product-detail/Multilayer-Ceramic-Capacitors-MLCC---SMD-SMT_Chinocera-Chinocera-HGC1210R5107M160NSVK_C7432790.html
footprint CAP-1210 (1210 (3225M) Capacitor)
pins: 1, 2

## HGC1210R5476M250NSVK
designator C?  Capacitance: 47uF  (hidden comment: *)
Capacitor, Ceramic (MLCC), 47uF, ±20%, 25V, X5R, ±20%, SMD 1210; Manufacturer: Chinocera; Manufacturer Part Number: HGC1210R5476M250NSVK; Package Size: 1210; JLCPCB Basic Part: No; JLCPCB Part Number: C7432791; Supplier 1: LCSC; Category: Capacitors - MLCC; Supplier Part Number 1: C7432791; Tolerance: ±20%; Voltage Rating: 25V; Temperature Coefficient: X5R; RoHS: Yes; ComponentLink1Description: Datasheet; ComponentLink1URL: https://wmsc.lcsc.com/wmsc/upload/file/pdf/v2/lcsc/2403201122_Chinocera-HGC1210R5476M250NSVK_C7432791.pdf; ComponentLink2Description: JLCPCB Part URL; ComponentLink2URL: https://jlcpcb.com/partdetail/C7432791; ComponentLink3Description: LCSC Part URL; ComponentLink3URL: https://lcsc.com/product-detail/Multilayer-Ceramic-Capacitors-MLCC---SMD-SMT_Chinocera-Chinocera-HGC1210R5476M250NSVK_C7432791.html
footprint CAP-1210 (1210 (3225M) Capacitor)
pins: 1, 2

## HMJ325AB7225KMHP
designator C?  Capacitance: 2.2uF  (hidden comment: *)
Capacitor, Ceramic (MLCC), 2.2uF, ±10%, 100V, X7R, ±10%, SMD 1210; Manufacturer: Taiyo Yuden; Manufacturer Part Number: HMJ325AB7225KMHP; Package Size: 1210; JLCPCB Basic Part: No; JLCPCB Part Number: C412614; Supplier 1: LCSC; Category: Capacitors - MLCC; Supplier Part Number 1: C412614; Tolerance: ±10%; Voltage Rating: 100V; Temperature Coefficient: X7R; RoHS: Yes; ComponentLink1Description: Datasheet; ComponentLink1URL: https://wmsc.lcsc.com/wmsc/upload/file/pdf/v2/lcsc/2211282230_Taiyo-Yuden-HMJ325AB7225KMHP_C412614.pdf; ComponentLink2Description: JLCPCB Part URL; ComponentLink2URL: https://jlcpcb.com/partdetail/C412614; ComponentLink3Description: LCSC Part URL; ComponentLink3URL: https://lcsc.com/product-detail/Multilayer-Ceramic-Capacitors-MLCC---SMD-SMT_Taiyo-Yuden-Taiyo-Yuden-HMJ325AB7225KMHP_C412614.html
footprint CAP-1210 (1210 (3225M) Capacitor)
pins: 1, 2

## HMJ325KC7475KMHPE
designator C?  Capacitance: 4.7uF  (hidden comment: *)
Capacitor, Ceramic (MLCC), 4.7uF, ±10%, 100V, X7S, ±10%, SMD 1210; Manufacturer: Taiyo Yuden; Manufacturer Part Number: HMJ325KC7475KMHPE; Package Size: 1210; JLCPCB Basic Part: No; JLCPCB Part Number: C412615; Supplier 1: LCSC; Category: Capacitors - MLCC; Supplier Part Number 1: C412615; Tolerance: ±10%; Voltage Rating: 100V; Temperature Coefficient: X7S; RoHS: Yes; ComponentLink1Description: Datasheet; ComponentLink1URL: https://wmsc.lcsc.com/wmsc/upload/file/pdf/v2/lcsc/2211282230_Taiyo-Yuden-HMJ325KC7475KMHPE_C412615.pdf; ComponentLink2Description: JLCPCB Part URL; ComponentLink2URL: https://jlcpcb.com/partdetail/C412615; ComponentLink3Description: LCSC Part URL; ComponentLink3URL: https://lcsc.com/product-detail/Multilayer-Ceramic-Capacitors-MLCC---SMD-SMT_Taiyo-Yuden-Taiyo-Yuden-HMJ325KC7475KMHPE_C412615.html
footprint CAP-1210 (1210 (3225M) Capacitor)
pins: 1, 2

## HMK325B7105KN-T
designator C?  Capacitance: 1uF  (hidden comment: *)
Capacitor, Ceramic (MLCC), 1uF, ±10%, 100V, X7R, ±10%, SMD 1210; Manufacturer: Taiyo Yuden; Manufacturer Part Number: HMK325B7105KN-T; Package Size: 1210; JLCPCB Basic Part: No; JLCPCB Part Number: C311691; Supplier 1: LCSC; Category: Capacitors - MLCC; Supplier Part Number 1: C311691; Tolerance: ±10%; Voltage Rating: 100V; Temperature Coefficient: X7R; RoHS: Yes; ComponentLink1Description: Datasheet; ComponentLink1URL: https://wmsc.lcsc.com/wmsc/upload/file/pdf/v2/lcsc/1810181422_Taiyo-Yuden-HMK325B7105KN-T_C311691.pdf; ComponentLink2Description: JLCPCB Part URL; ComponentLink2URL: https://jlcpcb.com/partdetail/C311691; ComponentLink3Description: LCSC Part URL; ComponentLink3URL: https://lcsc.com/product-detail/Multilayer-Ceramic-Capacitors-MLCC---SMD-SMT_Taiyo-Yuden-Taiyo-Yuden-HMK325B7105KN-T_C311691.html
footprint CAP-1210 (1210 (3225M) Capacitor)
pins: 1, 2

## HMK325B7105KNHT
designator C?  Capacitance: 1uF  (hidden comment: *)
Capacitor, Ceramic (MLCC), 1uF, ±10%, 100V, X7R, ±10%, SMD 1210; Manufacturer: Taiyo Yuden; Manufacturer Part Number: HMK325B7105KNHT; Package Size: 1210; JLCPCB Basic Part: No; JLCPCB Part Number: C385981; Supplier 1: LCSC; Category: Capacitors - MLCC; Supplier Part Number 1: C385981; Tolerance: ±10%; Voltage Rating: 100V; Temperature Coefficient: X7R; RoHS: Yes; ComponentLink1Description: Datasheet; ComponentLink1URL: https://wmsc.lcsc.com/wmsc/upload/file/pdf/v2/lcsc/2211282230_Taiyo-Yuden-HMK325B7105KNHT_C385981.pdf; ComponentLink2Description: JLCPCB Part URL; ComponentLink2URL: https://jlcpcb.com/partdetail/C385981; ComponentLink3Description: LCSC Part URL; ComponentLink3URL: https://lcsc.com/product-detail/Multilayer-Ceramic-Capacitors-MLCC---SMD-SMT_Taiyo-Yuden-Taiyo-Yuden-HMK325B7105KNHT_C385981.html
footprint CAP-1210 (1210 (3225M) Capacitor)
pins: 1, 2

## HMK325B7225KM-P
designator C?  Capacitance: 2.2uF  (hidden comment: *)
Capacitor, Ceramic (MLCC), 2.2uF, ±10%, 100V, X7R, ±10%, SMD 1210; Manufacturer: Taiyo Yuden; Manufacturer Part Number: HMK325B7225KM-P; Package Size: 1210; JLCPCB Basic Part: No; JLCPCB Part Number: C385983; Supplier 1: LCSC; Category: Capacitors - MLCC; Supplier Part Number 1: C385983; Tolerance: ±10%; Voltage Rating: 100V; Temperature Coefficient: X7R; RoHS: Yes; ComponentLink1Description: Datasheet; ComponentLink1URL: https://wmsc.lcsc.com/wmsc/upload/file/pdf/v2/lcsc/2304140030_Taiyo-Yuden-HMK325B7225KM-P_C385983.pdf; ComponentLink2Description: JLCPCB Part URL; ComponentLink2URL: https://jlcpcb.com/partdetail/C385983; ComponentLink3Description: LCSC Part URL; ComponentLink3URL: https://lcsc.com/product-detail/Multilayer-Ceramic-Capacitors-MLCC---SMD-SMT_Taiyo-Yuden-Taiyo-Yuden-HMK325B7225KM-P_C385983.html
footprint CAP-1210 (1210 (3225M) Capacitor)
pins: 1, 2

## HMK325B7225KMHP
designator C?  Capacitance: 2.2uF  (hidden comment: *)
Capacitor, Ceramic (MLCC), 2.2uF, ±10%, 100V, ±10%, SMD 1210; Manufacturer: Taiyo Yuden; Manufacturer Part Number: HMK325B7225KMHP; Package Size: 1210; JLCPCB Basic Part: No; JLCPCB Part Number: C385982; Supplier 1: LCSC; Category: Capacitors - MLCC; Supplier Part Number 1: C385982; Tolerance: ±10%; Voltage Rating: 100V; RoHS: Yes; ComponentLink1Description: Datasheet; ComponentLink1URL: https://wmsc.lcsc.com/wmsc/upload/file/pdf/v2/lcsc/2304140030_Taiyo-Yuden-HMK325B7225KMHP_C385982.pdf; ComponentLink2Description: JLCPCB Part URL; ComponentLink2URL: https://jlcpcb.com/partdetail/C385982; ComponentLink3Description: LCSC Part URL; ComponentLink3URL: https://lcsc.com/product-detail/Multilayer-Ceramic-Capacitors-MLCC---SMD-SMT_Taiyo-Yuden-Taiyo-Yuden-HMK325B7225KMHP_C385982.html
footprint CAP-1210 (1210 (3225M) Capacitor)
pins: 1, 2

## HMK325B7225KN-T
designator C?  Capacitance: 2.2uF  (hidden comment: *)
Capacitor, Ceramic (MLCC), 2.2uF, ±10%, 100V, X7R, ±10%, SMD 1210; Manufacturer: Taiyo Yuden; Manufacturer Part Number: HMK325B7225KN-T; Package Size: 1210; JLCPCB Basic Part: No; JLCPCB Part Number: C92775; Supplier 1: LCSC; Category: Capacitors - MLCC; Supplier Part Number 1: C92775; Tolerance: ±10%; Voltage Rating: 100V; Temperature Coefficient: X7R; RoHS: Yes; ComponentLink1Description: Datasheet; ComponentLink1URL: https://wmsc.lcsc.com/wmsc/upload/file/pdf/v2/lcsc/2211282300_Taiyo-Yuden-HMK325B7225KN-T_C92775.pdf; ComponentLink2Description: JLCPCB Part URL; ComponentLink2URL: https://jlcpcb.com/partdetail/C92775; ComponentLink3Description: LCSC Part URL; ComponentLink3URL: https://lcsc.com/product-detail/Multilayer-Ceramic-Capacitors-MLCC---SMD-SMT_Taiyo-Yuden-Taiyo-Yuden-HMK325B7225KN-T_C92775.html
footprint CAP-1210 (1210 (3225M) Capacitor)
pins: 1, 2

## HMK325BJ105KN-T
designator C?  Capacitance: 1uF  (hidden comment: *)
Capacitor, Ceramic (MLCC), 1uF, ±10%, 100V, X5R, ±10%, SMD 1210; Manufacturer: Taiyo Yuden; Manufacturer Part Number: HMK325BJ105KN-T; Package Size: 1210; JLCPCB Basic Part: No; JLCPCB Part Number: C2176253; Supplier 1: LCSC; Category: Capacitors - MLCC; Supplier Part Number 1: C2176253; Tolerance: ±10%; Voltage Rating: 100V; Temperature Coefficient: X5R; RoHS: Yes; ComponentLink1Description: Datasheet; ComponentLink1URL: https://wmsc.lcsc.com/wmsc/upload/file/pdf/v2/lcsc/2211282000_Taiyo-Yuden-HMK325BJ105KN-T_C2176253.pdf; ComponentLink2Description: JLCPCB Part URL; ComponentLink2URL: https://jlcpcb.com/partdetail/C2176253; ComponentLink3Description: LCSC Part URL; ComponentLink3URL: https://lcsc.com/product-detail/Multilayer-Ceramic-Capacitors-MLCC---SMD-SMT_Taiyo-Yuden-Taiyo-Yuden-HMK325BJ105KN-T_C2176253.html
footprint CAP-1210 (1210 (3225M) Capacitor)
pins: 1, 2

## HMK325BJ475KN-TE
designator C?  Capacitance: 4.7uF  (hidden comment: *)
Capacitor, Ceramic (MLCC), 4.7uF, ±10%, 100V, X5R, ±10%, SMD 1210; Manufacturer: Taiyo Yuden; Manufacturer Part Number: HMK325BJ475KN-TE; Package Size: 1210; JLCPCB Basic Part: No; JLCPCB Part Number: C2831628; Supplier 1: LCSC; Category: Capacitors - MLCC; Supplier Part Number 1: C2831628; Tolerance: ±10%; Voltage Rating: 100V; Temperature Coefficient: X5R; RoHS: Yes; ComponentLink1Description: Datasheet; ComponentLink1URL: https://wmsc.lcsc.com/wmsc/upload/file/pdf/v2/lcsc/2306061117_Taiyo-Yuden-HMK325BJ475KN-TE_C2831628.pdf; ComponentLink2Description: JLCPCB Part URL; ComponentLink2URL: https://jlcpcb.com/partdetail/C2831628; ComponentLink3Description: LCSC Part URL; ComponentLink3URL: https://lcsc.com/product-detail/Multilayer-Ceramic-Capacitors-MLCC---SMD-SMT_Taiyo-Yuden-Taiyo-Yuden-HMK325BJ475KN-TE_C2831628.html
footprint CAP-1210 (1210 (3225M) Capacitor)
pins: 1, 2

## HMK325C7475KM-PE
designator C?  Capacitance: 4.7uF  (hidden comment: *)
Capacitor, Ceramic (MLCC), 4.7uF, ±10%, 100V, X7S, ±10%, SMD 1210; Manufacturer: Taiyo Yuden; Manufacturer Part Number: HMK325C7475KM-PE; Package Size: 1210; JLCPCB Basic Part: No; JLCPCB Part Number: C385987; Supplier 1: LCSC; Category: Capacitors - MLCC; Supplier Part Number 1: C385987; Tolerance: ±10%; Voltage Rating: 100V; Temperature Coefficient: X7S; RoHS: Yes; ComponentLink1Description: Datasheet; ComponentLink1URL: https://wmsc.lcsc.com/wmsc/upload/file/pdf/v2/lcsc/2309051401_Taiyo-Yuden-HMK325C7475KM-PE_C385987.pdf; ComponentLink2Description: JLCPCB Part URL; ComponentLink2URL: https://jlcpcb.com/partdetail/C385987; ComponentLink3Description: LCSC Part URL; ComponentLink3URL: https://lcsc.com/product-detail/Multilayer-Ceramic-Capacitors-MLCC---SMD-SMT_Taiyo-Yuden-Taiyo-Yuden-HMK325C7475KM-PE_C385987.html
footprint CAP-1210 (1210 (3225M) Capacitor)
pins: 1, 2
